# Altium footprint library WaterSupplyController.PcbLib: 37 footprints (part 2 of 3)
Each footprint in its own frame and in the unit in brackets; x right, y up, seen from the top. Pads: shape width x height; smd on the part's side, far side on the other; paste and mask are expansions set on the pad; w line width, h text height; cw(c..) or ccw(c..) is an arc to the next point about the centre after c.
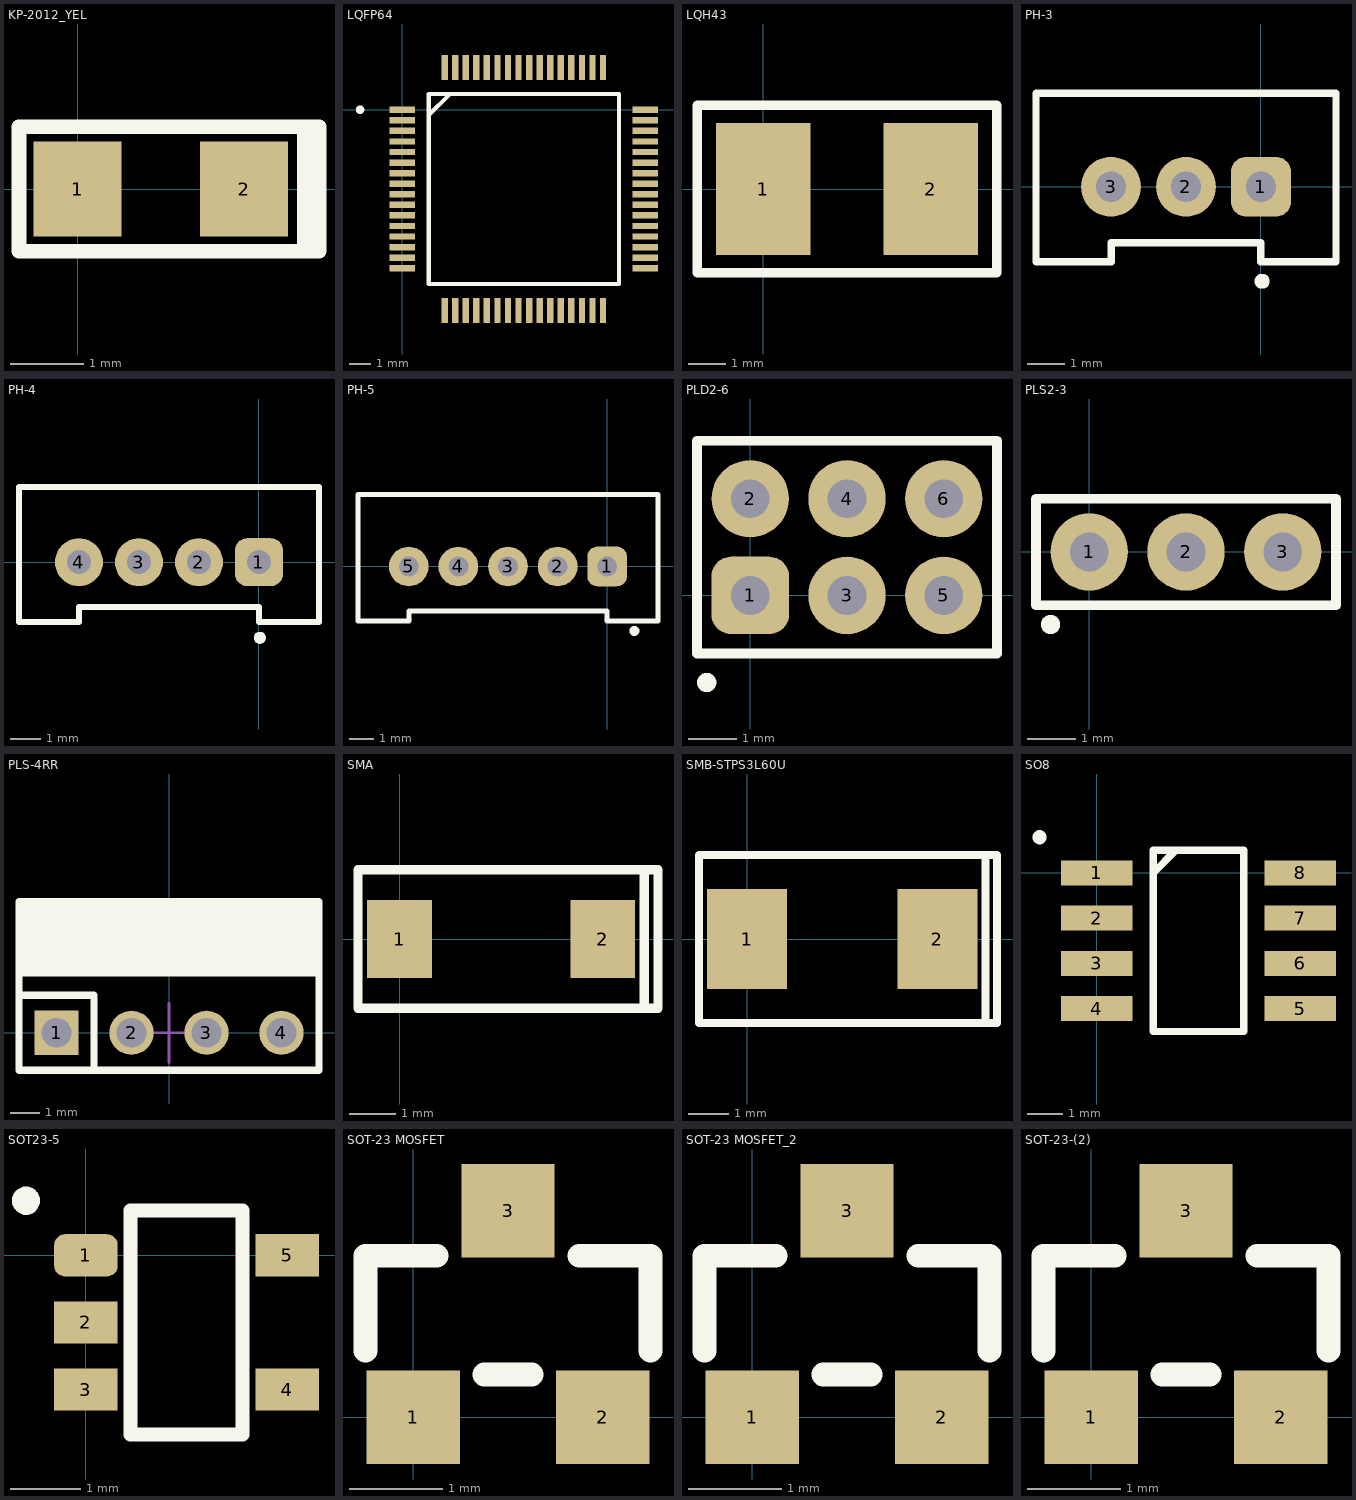
[diagram p1: the footprints below, top view; thin cyan lines are the x and y axes]

## KP-2012_YEL [mm] "Светодиод 0805 Жёлтый"
pads (2):
  rect 1.2x1.3 smd mask+0.025: 1(0,0) 2(2.275,0)
Top Overlay:
  lines w0.2: 3.1,-0.85 3.1,0.85 ; -0.8,-0.85 -0.8,0.85 3.3,0.85 3.3,-0.85 -0.8,-0.85
3D body "everlight-17-21-0805LED-YELLOW.SLDPRT": height 1.1, standoff -0.01, extent 0.15,-0.625 2.15,0.625

## LQFP64 [mm]
pads (64):
  rect 1.2x0.3 smd mask+0.02: 1(0,0) 2(0,-0.5) 3(0,-1) 4(0,-1.5) 5(0,-2) 6(0,-2.5) 7(0,-3) 8(0,-3.5) 9(0,-4) 10(0,-4.5) 11(0,-5) 12(0,-5.5) 13(0,-6) 14(0,-6.5) 15(0,-7) 16(0,-7.5) 33(11.5,-7.5) 34(11.5,-7) 35(11.5,-6.5) 36(11.5,-6) 37(11.5,-5.5) 38(11.5,-5) 39(11.5,-4.5) 40(11.5,-4) 41(11.5,-3.5) 42(11.5,-3) 43(11.5,-2.5) 44(11.5,-2) 45(11.5,-1.5) 46(11.5,-1) 47(11.5,-0.5) 48(11.5,0)
  rect 0.3x1.2 smd mask+0.02: 17(2,-9.5) 18(2.5,-9.5) 19(3,-9.5) 20(3.5,-9.5) 21(4,-9.5) 22(4.5,-9.5) 23(5,-9.5) 24(5.5,-9.5) 25(6,-9.5) 26(6.5,-9.5) 27(7,-9.5) 28(7.5,-9.5) 29(8,-9.5) 30(8.5,-9.5) 31(9,-9.5) 32(9.5,-9.5) 49(9.5,2) 50(9,2) 51(8.5,2) 52(8,2) 53(7.5,2) 54(7,2) 55(6.5,2) 56(6,2) 57(5.5,2) 58(5,2) 59(4.5,2) 60(4,2) 61(3.5,2) 62(3,2) 63(2.5,2) 64(2,2)
Top Overlay:
  circle w0.2: c-2,0 r0.1
  lines w0.2: 1.25,-0.25 2.25,0.75 ; 1.25,-8.25 10.25,-8.25 10.25,0.75 1.25,0.75 1.25,-8.25
3D body "User Library-IPC QFP-full.SLDPRT": height 1.75, standoff 0, extent -0.289,-9.764 11.739,2.264

## LQH43 [mm]
pads (2):
  rect 2.5x3.5 smd mask+0.025: 1(0,0) 2(4.445,0)
Top Overlay:
  lines w0.254: -1.746,-2.222 -1.746,2.222 6.191,2.222 6.191,-2.222 -1.746,-2.222
3D body "User Library-L1812.SLDPRT": height 2.75, standoff 0, extent -0.2,-1.7 4.6,1.7

## PH-3 [mm]
pads (3):
  rrect50% 1.6x1.6 hole 0.8 mask+0.025: 1(0,0)
  round 1.6 hole 0.8 mask+0.025: 2(-2,0) 3(-4,0)
Top Overlay:
  circle w0.2: c0.03,-2.52 r0.1
  lines w0.2: -6,-2 -4,-2 -4,-1.5 0,-1.5 0,-2 2,-2 2,2.5 -6,2.5 -6,-2
3D body "User Library-B3B-PH-K-S(LF)(SN).SLDPRT": height 6, standoff -3.4, extent -5.95,-1.7 1.95,2.8

## PH-4 [mm]
pads (4):
  rrect50% 1.6x1.6 hole 0.8 mask+0.025: 1(0,0)
  round 1.6 hole 0.8 mask+0.025: 2(-2,0) 3(-4,0) 4(-6,0)
Top Overlay:
  circle w0.2: c0.03,-2.52 r0.1
  lines w0.2: -8,-2 -8,2.5 2,2.5 2,-2 0,-2 0,-1.5 -6,-1.5 -6,-2 -8,-2
3D body "User Library-b4b-ph-k-s.SLDPRT": height 6, standoff -3, extent -7.947,-1.691 1.953,2.809

## PH-5 [mm]
pads (5):
  rrect50% 1.6x1.6 hole 0.8 mask+0.025: 1(0,0)
  round 1.6 hole 0.8 mask+0.025: 2(-2,0) 3(-4,0) 4(-6,0) 5(-8,0)
Top Overlay:
  circle w0.2: c1.1,-2.6 r0.1
  lines w0.2: -10.05,-2.2 -10.05,2.9 2.05,2.9 2.05,-2.2 0,-2.2 0,-1.8 -8,-1.8 -8,-2.2 -10.05,-2.2
3D body "User Library-B5B-PH-K-S(LF)(SN).SLDPRT": height 6, standoff -3.4, extent -9.95,-1.7 1.95,2.8

## PLD2-6 [mm]
pads (6):
  rrect50% 1.6x1.6 hole 0.8 mask+0.025: 1(0,0)
  round 1.6 hole 0.8 mask+0.025: 2(0,2) 3(2,0) 4(2,2) 5(4,0) 6(4,2)
Top Overlay:
  circle w0.2: c-0.9,-1.8 r0.1
  lines w0.2: -1.1,-1.2 5.1,-1.2 5.1,3.2 -1.1,3.2 -1.1,-1.2
3D body "User Library-PLD2-6.SLDPRT": height 5.5, standoff -2.6, extent -1,-1.1 5,3.1

## PLS2-3 [mm]
pads (3):
  round 1.6 hole 0.8 mask+0.025: 1(0,0) 2(2,0) 3(4,0)
Top Overlay:
  circle w0.2: c-0.8,-1.5 r0.1
  lines w0.2: -1.1,-1.1 -1.1,1.1 5.1,1.1 5.1,-1.1 -1.1,-1.1
3D body "User Library-pls2-3.STEP": height 6, standoff -2.8, extent -1,-1 5,1

## PLS-4RR [mm]
height 10
pads (4):
  rect 1.5x1.5 hole 1: 1(-3.81,0)
  round 1.5 hole 1: 2(-1.27,0) 3(1.27,0) 4(3.81,0)
Top Overlay:
  region: 5.08,1.905 5.08,4.445 -5.08,4.445 -5.08,1.905
  lines w0.25: -5.08,1.27 -2.54,1.27 -2.54,-1.27 ; -5.08,-1.27 5.08,-1.27 5.08,4.445 -5.08,4.445 -5.08,-1.27
Mechanical 15:
  lines w0.1: -1,0 1,0 ; 0,-1 0,1 ; -5.08,-1.27 -5.08,4.445 5.08,4.445 5.08,-1.27 -5.08,-1.27
3D body "User Library-Header_Male_RA_Low_4Pin.STEP": height 3.01, standoff -2.5, extent -5.08,-0.32 5.08,9.81

## SMA [mm]
height 10
pads (2):
  rect 1.4x1.7 smd mask+0.025: 1(0,0) 2(4.4,0)
Top Overlay:
  lines w0.2: 5.3,-1.5 5.3,1.4 ; -0.9,-1.5 5.6,-1.5 5.6,1.5 -0.9,1.5 -0.9,-1.5
3D body "User Library-DO-214AC(SMA).SLDPRT": height 2.34, standoff 0.06, extent -0.543,-1.397 4.943,1.397

## SMB-STPS3L60U [mm]
pads (2):
  rect 2x2.5 smd mask+0.025: 1(0,0) 2(4.763,0)
Top Overlay:
  lines w0.2: 5.957,-2.1 5.957,2.1 ; -1.2,-2.1 6.25,-2.1 6.25,2.1 -1.2,2.1 -1.2,-2.1
3D body "User Library-DO-214AA(SMB).SLDPRT": height 2.6, standoff -0.05, extent -0.394,-1.975 5.194,1.975

## SO8 [mm]
pads (8):
  rect 2x0.7 smd mask+0.025: 1(0,0) 2(0,-1.27) 3(0,-2.54) 4(0,-3.81) 5(5.715,-3.81) 6(5.715,-2.54) 7(5.715,-1.27) 8(5.715,0)
Top Overlay:
  circle w0.2: c-1.6,1 r0.1
  lines w0.2: 1.587,0 2.222,0.635 ; 1.587,-4.445 1.587,0.635 4.127,0.635 4.127,-4.445 1.587,-4.445
3D body "User Library-SOIC-8.SLDPRT": height 1.5, standoff -0.25, extent -0.136,-4.405 5.978,0.595

## SOT23-5 [mm]
pads (5):
  rrect50% 0.9x0.6 smd mask+0.025: 1(0,0)
  rect 0.9x0.6 smd mask+0.025: 2(0,-0.953) 3(0,-1.905) 4(2.857,-1.905) 5(2.857,0)
Top Overlay:
  circle w0.2: c-0.85,0.775 r0.1
  lines w0.2: 0.635,-2.54 2.222,-2.54 2.222,0.635 0.635,0.635 0.635,-2.54
3D body "User Library-SOT23-5.STEP": height 1.09, standoff -0.01, extent 0,-2.399 2.8,0.5

## SOT-23 MOSFET [mm]
pads (3):
  rect 1x1 smd: 1(0,0) 2(2.032,0) 3(1.016,2.21)
Top Overlay:
  lines w0.254: -0.508,0.711 -0.508,1.727 0.254,1.727 ; 0.762,0.457 1.27,0.457 ; 1.778,1.727 2.54,1.727 2.54,0.711
3D body "User Library-SOT23A.SLDPRT": height 1.45, standoff 0, extent -0.534,-0.31 2.566,2.593

## SOT-23 MOSFET_2 [mm]
pads (3):
  rect 1x1 smd: 1(0,0) 2(2.032,0) 3(1.016,2.21)
Top Overlay:
  lines w0.254: -0.508,0.711 -0.508,1.727 0.254,1.727 ; 0.762,0.457 1.27,0.457 ; 1.778,1.727 2.54,1.727 2.54,0.711
3D body "User Library-SOT23A.SLDPRT": height 1.45, standoff 0, extent -0.534,-0.31 2.566,2.593

## SOT-23-(2) [mm]
pads (3):
  rect 1x1 smd: 1(0,0) 2(2.032,0) 3(1.016,2.21)
Top Overlay:
  lines w0.254: -0.508,0.711 -0.508,1.727 0.254,1.727 ; 0.762,0.457 1.27,0.457 ; 1.778,1.727 2.54,1.727 2.54,0.711
3D body "User Library-SOT23A.SLDPRT": height 1.45, standoff 0, extent -0.534,-0.31 2.566,2.593